# Altium footprint library rescap.PcbLib: 83 footprints (part 2 of 6)
Each footprint in its own frame and in the unit in brackets; x right, y up, seen from the top. Pads: shape width x height; smd on the part's side, far side on the other; paste and mask are expansions set on the pad; w line width, h text height; cw(c..) or ccw(c..) is an arc to the next point about the centre after c.
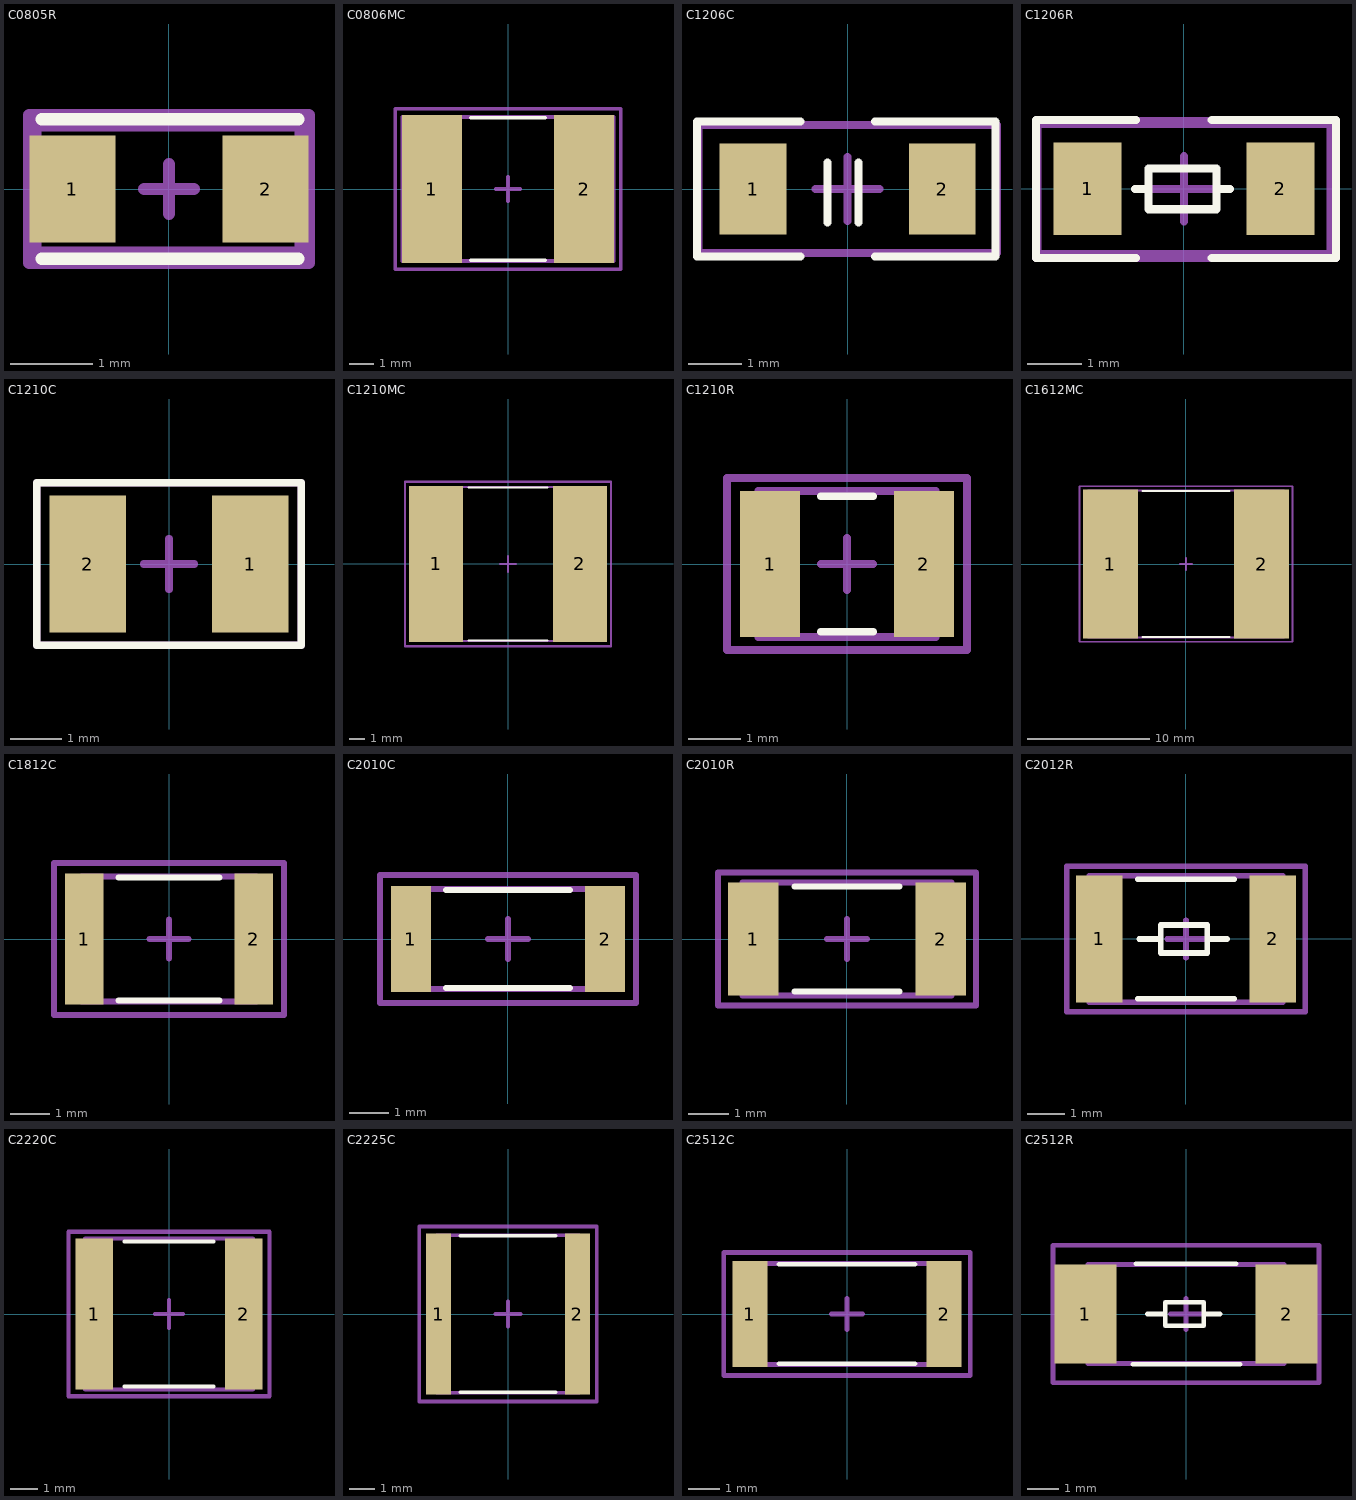
[diagram p1: the footprints below, top view; thin cyan lines are the x and y axes]

## C0805R [mm]
height 1
pads (2):
  rect 1.05x1.3 smd: 1(-1.175,0) 2(1.175,0)
Top Overlay:
  lines w0.15: -1.55,-0.85 1.575,-0.85 ; -1.55,0.85 1.575,0.85
Mechanical 15:
  lines w0.15: -0.3,0 0.3,0 ; 0,-0.3 0,0.3 ; -1.7,-0.9 1.7,-0.9 1.7,0.9 -1.7,0.9 -1.7,-0.9
Mechanical 29:
  lines w0.15: -1.625,-0.775 -1.625,0.775 1.6,0.775 1.6,-0.775 -1.625,-0.775
  text ".Designator" at -1.5,-0.5 h1
3D body: height 0.5, standoff 0, extent 0.4,-0.6 1,0.6
3D body: height 0.5, standoff 0, extent -0.4,-0.6 0.4,0.6
3D body: height 0.5, standoff 0, extent -1,-0.6 -0.4,0.6

## C0806MC [mm] "8,0x6,0x4,0"
height 4
pads (2):
  rect 2.5x6.15 smd: 1(-3.175,0) 2(3.175,0)
Top Overlay:
  lines w0.15: -1.55,-2.975 1.55,-2.975 ; -1.55,2.975 1.55,2.975
Mechanical 15:
  lines w0.15: -0.5,0 0.5,0 ; 0,-0.5 0,0.5 ; -4.7,-3.35 -4.7,3.35 4.7,3.35 4.7,-3.35 -4.7,-3.35
Mechanical 29:
  lines w0.15: -4.4,-3 4.4,-3 4.4,3 -4.4,3 -4.4,-3 ; -4,-3 -4,3 4,3 4,-3 -4,-3
3D body "CAPC8060X40N.step": height 4, standoff 0, extent -4,-3 4,3

## C1206C [mm]
pads (2):
  rect 1.25x1.7 smd: 1(-1.775,0) 2(1.775,0)
Top Overlay:
  lines w0.15: -0.886,-1.27 -2.825,-1.27 -2.825,1.27 -0.886,1.27 ; -0.375,-0.625 -0.375,0.5 ; 0.2,-0.625 0.2,0.5 ; 0.511,-1.27 2.775,-1.27 2.775,1.27 0.511,1.27
Mechanical 15:
  lines w0.15: -0.6,0 0.6,0 ; 0,-0.6 0,0.6 ; -2.8,-1.2 2.8,-1.2 2.8,1.2 -2.8,1.2 -2.8,-1.2
3D body: height 0.8, standoff 0, extent 0.9,-0.8 1.7,0.8
3D body: height 0.8, standoff 0, extent -0.9,-0.8 0.9,0.8
3D body: height 0.8, standoff 0, extent -1.7,-0.8 -0.9,0.8

## C1206R [mm]
pads (2):
  rect 1.25x1.7 smd: 1(-1.775,0) 2(1.775,0)
Top Overlay:
  lines w0.15: -0.9,0 -0.65,0 ; -0.886,-1.27 -2.725,-1.27 -2.725,1.27 -0.886,1.27 ; 0.511,-1.27 2.797,-1.27 2.797,1.27 0.511,1.27 ; 0.85,0 0.6,0 ; -0.65,0 -0.65,0.375 0.6,0.375 0.6,0 ; -0.65,0 -0.65,-0.375 0.6,-0.375 0.6,0
Mechanical 15:
  lines w0.15: -0.6,0 0.6,0 ; 0,-0.6 0,0.6 ; -2.7,-1.2 -2.7,1.2 2.7,1.2 2.7,-1.2 -2.7,-1.2
Mechanical 29:
  lines w0.15: -2.725,-1.275 2.8,-1.275 2.8,1.25 -2.725,1.25 -2.725,-1.275
  text ".Designator" at -2.3,-0.4 h1
3D body: height 0.8, standoff 0, extent -1.7,-0.8 -0.9,0.8
3D body: height 0.8, standoff 0, extent -0.9,-0.8 0.9,0.8
3D body: height 0.8, standoff 0, extent 0.9,-0.8 1.7,0.8

## C1210C [mm] "Chip Capacitor, 2-Leads, Body 3,2x2,5mm, IPC Medium Density"
height 0.7
pads (2):
  rect 1.5x2.7 smd: 1(1.6,0) 2(-1.6,0)
Top Overlay:
  lines w0.15: -2.6,-1.6 -2.6,1.6 2.6,1.6 2.6,-1.6 -2.6,-1.6
Mechanical 15:
  lines w0.15: -0.5,0 0.5,0 ; 0,-0.5 0,0.5 ; -2.6,-1.6 -2.6,-1.05 -2.6,0.55 -2.6,1.6 2.6,1.6 2.6,-1.6 -2.6,-1.6
3D body: height 1.6, standoff 0, extent -2,-1.3 -0.9,1.3
3D body: height 1.6, standoff 0, extent -0.9,-1.3 0.9,1.3
3D body: height 1.6, standoff 0, extent 0.9,-1.3 2,1.3

## C1210MC [mm] "12,0x10,0x4,5"
height 4.5
pads (2):
  rect 3.5x10.15 smd: 1(-4.675,0) 2(4.675,0)
Top Overlay:
  lines w0.15: -2.55,-4.975 2.55,-4.975 ; -2.55,4.975 2.55,4.975
Mechanical 15:
  lines w0.15: -0.5,0 0.5,0 ; 0,-0.5 0,0.5 ; -6.7,-5.35 6.7,-5.35 6.7,5.35 -6.7,5.35 -6.7,-5.35
Mechanical 29:
  lines w0.15: -6,-5 -6,5 ; -6,-5 6,-5 ; -6,-5 6,-5 ; -6,-5 -6,5 ; -6,5 6,5 ; -6,5 6,5 ; 6,-5 6,5 ; 6,-5 6,5
  text ".Designator" at -3.3,-0.3 h1
3D body "CAPC120100X45N.step": height 4.5, standoff 0, extent -6,-5 6,5

## C1210R [mm]
height 0.7
pads (2):
  rect 1.15x2.8 smd: 1(-1.475,0) 2(1.475,0)
Top Overlay:
  lines w0.15: -0.5,-1.3 0.5,-1.3 ; -0.5,1.3 0.5,1.3
Mechanical 15:
  lines w0.15: -0.5,0 0.5,0 ; 0,-0.5 0,0.5 ; -2.3,-1.65 -2.3,1.65 2.3,1.65 2.3,-1.65 -2.3,-1.65
Mechanical 29:
  lines w0.15: -1.7,-1.4 -1.7,1.4 1.7,1.4 1.7,-1.4 -1.7,-1.4
  text ".Designator" at -1.5,-0.4 h1
3D body "C1210R.step": height 0.7, standoff 0, extent -1.7,-1.4 1.7,1.4

## C1612MC [mm] "16,0х12,0х5,5"
height 5.5
pads (2):
  rect 4.5x12.15 smd: 1(-6.175,0) 2(6.175,0)
Top Overlay:
  lines w0.15: -3.55,-5.975 3.55,-5.975 ; -3.55,5.975 3.55,5.975
Mechanical 15:
  lines w0.15: -0.5,0 0.5,0 ; 0,-0.5 0,0.5 ; -8.7,-6.35 -8.7,6.35 8.7,6.35 8.7,-6.35 -8.7,-6.35
Mechanical 29:
  lines w0.15: -8,-6 -8,6 8,6 8,-6 -8,-6 ; -7.3,-6 0,-6 7.3,-6 7.3,0 7.3,6 0,6 -7.3,6 -7.3,0 -7.3,-6
  text ".Designator" at -3.7,-0.3 h1
3D body "CAPC160120X55N.step": height 5.5, standoff 0, extent -8,-6 8,6

## C1812C [mm]
height 1
pads (2):
  rect 1x3.35 smd: 1(-2.175,0) 2(2.175,0)
Top Overlay:
  lines w0.15: -1.3,-1.575 1.3,-1.575 ; -1.3,1.575 1.3,1.575
Mechanical 15:
  lines w0.15: -0.5,0 0.5,0 ; 0,-0.5 0,0.5 ; -2.95,-1.95 2.95,-1.95 2.95,1.95 -2.95,1.95 -2.95,-1.95
Mechanical 29:
  lines w0.15: -2.25,-1.6 2.25,-1.6 2.25,1.6 -2.25,1.6 -2.25,-1.6
  text ".Designator" at -2,-0.4 h1
3D body "C1812C.step": height 1, standoff 0, extent -2.25,-1.6 2.25,1.6

## C2010C [mm] "Chip2PinSM127P600-8N"
height 0.55
pads (2):
  rect 1x2.65 smd: 1(-2.425,0) 2(2.425,0)
Top Overlay:
  lines w0.15: -1.55,-1.225 1.55,-1.225 ; -1.55,1.225 1.55,1.225
Mechanical 15:
  lines w0.15: -0.5,0 0.5,0 ; 0,-0.5 0,0.5 ; -3.2,-1.6 3.2,-1.6 3.2,1.6 -3.2,1.6 -3.2,-1.6
Mechanical 29:
  lines w0.15: -2.5,-1.25 2.5,-1.25 2.5,1.25 -2.5,1.25 -2.5,-1.25
  text ".Designator" at -2.2,-0.3 h1
3D body "C2010C.step": height 0.55, standoff 0, extent -2.5,-1.25 2.5,1.25

## C2010R [mm]
height 0.7
pads (2):
  rect 1.25x2.8 smd: 1(-2.325,0) 2(2.325,0)
Top Overlay:
  lines w0.15: -1.3,-1.3 1.3,-1.3 ; -1.3,1.3 1.3,1.3
Mechanical 15:
  lines w0.15: -0.5,0 0.5,0 ; 0,-0.5 0,0.5 ; -3.2,-1.65 -3.2,1.65 3.2,1.65 3.2,-1.65 -3.2,-1.65
Mechanical 29:
  lines w0.15: -2.6,-1.4 -2.6,1.4 2.6,1.4 2.6,-1.4 -2.6,-1.4
  text ".Designator" at -2.2,-0.5 h1
3D body "C2010R.step": height 0.7, standoff 0, extent -2.6,-1.4 2.6,1.4

## C2012R [mm]
height 0.7
pads (2):
  rect 1.25x3.4 smd: 1(-2.325,0) 2(2.325,0)
Top Overlay:
  lines w0.15: -1.3,-1.6 1.3,-1.6 ; -1.3,1.6 1.3,1.6 ; -1.25,0 -0.675,0 ; 1.1,0 0.575,0 ; -0.675,0 -0.675,-0.375 0.575,-0.375 0.575,0 ; -0.675,0 -0.675,0.375 0.575,0.375 0.575,0
Mechanical 15:
  lines w0.15: -0.5,0 0.5,0 ; 0,-0.5 0,0.5 ; -3.2,-1.95 -3.2,1.95 3.2,1.95 3.2,-1.95 -3.2,-1.95
Mechanical 29:
  lines w0.15: -2.6,-1.7 -2.6,1.7 2.6,1.7 2.6,-1.7 -2.6,-1.7
  text ".Designator" at -2.2,-0.4 h1
3D body "C2012R.step": height 0.7, standoff 0, extent -2.6,-1.7 2.6,1.7

## C2220C [mm] "Chip Capacitor, 2-Leads, Body 5,65x5,00mm, IPC Medium Density"
height 2.5
pads (2):
  rect 1.35x5.4 smd: 1(-2.675,0) 2(2.675,0)
Top Overlay:
  lines w0.15: -1.6,-2.6 1.6,-2.6 ; -1.6,2.6 1.6,2.6
Mechanical 15:
  lines w0.15: -0.5,0 0.5,0 ; 0,-0.5 0,0.5 ; -3.6,-2.95 -3.6,2.95 3.6,2.95 3.6,-2.95 -3.6,-2.95
Mechanical 29:
  lines w0.15: -3,-2.7 -3,2.7 3,2.7 3,-2.7 -3,-2.7
  text ".Designator" at -2.5,-0.4 h1
3D body "C2220C.step": height 2.5, standoff 0, extent -3,-2.7 3,2.7

## C2225C [mm] "Chip2PinSM127P600-8N"
height 2
pads (2):
  rect 1x6.45 smd: 1(-2.775,0) 2(2.775,0)
Top Overlay:
  lines w0.15: -1.9,-3.125 1.9,-3.125 ; -1.9,3.125 1.9,3.125
Mechanical 15:
  lines w0.15: -0.5,0 0.5,0 ; 0,-0.5 0,0.5 ; -3.55,-3.5 3.55,-3.5 3.55,3.5 -3.55,3.5 -3.55,-3.5
Mechanical 29:
  lines w0.15: -2.85,-3.15 2.85,-3.15 2.85,3.15 -2.85,3.15 -2.85,-3.15
  text ".Designator" at -2.6,-0.4 h1
3D body "C2225C.step": height 2, standoff 0, extent -2.85,-3.15 2.85,3.15

## C2512C [mm] "Chip Capacitor, 2-Leads, Body 6,40x3,20mm, IPC Medium Density"
height 2
pads (2):
  rect 1.1x3.35 smd: 1(-3.075,0) 2(3.075,0)
Top Overlay:
  lines w0.15: -2.15,-1.575 2.15,-1.575 ; -2.15,1.575 2.15,1.575
Mechanical 15:
  lines w0.15: -0.5,0 0.5,0 ; 0,-0.5 0,0.5 ; -3.9,-1.95 -3.9,1.95 3.9,1.95 3.9,-1.95 -3.9,-1.95
Mechanical 29:
  lines w0.15: -3.2,-1.6 -3.2,1.6 3.2,1.6 3.2,-1.6 -3.2,-1.6
  text ".Designator" at -2.6,-0.3 h1
3D body "C2512C.step": height 2, standoff 0, extent -3.2,-1.6 3.2,1.6

## C2512R [mm] "Chip Resistor, 2-Leads, Body 6,3x3,2mm, IPC Low Density"
height 0.55
pads (2):
  rect 2x3.2 smd: 1(-3.25,0) 2(3.25,0)
Top Overlay:
  lines w0.15: -1.725,-1.625 1.75,-1.625 ; -1.625,1.625 1.625,1.625 ; -1.25,0 -0.675,0 ; 1.1,0 0.575,0 ; -0.675,0 -0.675,0.375 0.575,0.375 0.575,0 ; -0.675,0 -0.675,-0.375 0.575,-0.375 0.575,0
Mechanical 15:
  lines w0.15: -0.5,0 0.5,0 ; 0,-0.5 0,0.5 ; -4.3,-2.225 -4.3,2.225 4.3,2.225 4.3,-2.225 -4.3,-2.225
Mechanical 29:
  lines w0.15: -3.175,-1.6 -3.175,1.6 3.175,1.6 3.175,-1.6 -3.175,-1.6
  text ".Designator" at -3,-0.4 h1
3D body: height 0.55, standoff 0, extent -2.5,-1.6 2.5,1.6
3D body: height 0.55, standoff 0, extent 2.5,-1.6 3.2,1.6
3D body: height 0.55, standoff 0, extent -3.2,-1.6 -2.5,1.6